# Altium footprint library Cty1.PcbLib: 870 footprints (part 11 of 55)
Each footprint in its own frame and in the unit in brackets; x right, y up, seen from the top. Pads: shape width x height; smd on the part's side, far side on the other; paste and mask are expansions set on the pad; w line width, h text height; cw(c..) or ccw(c..) is an arc to the next point about the centre after c.
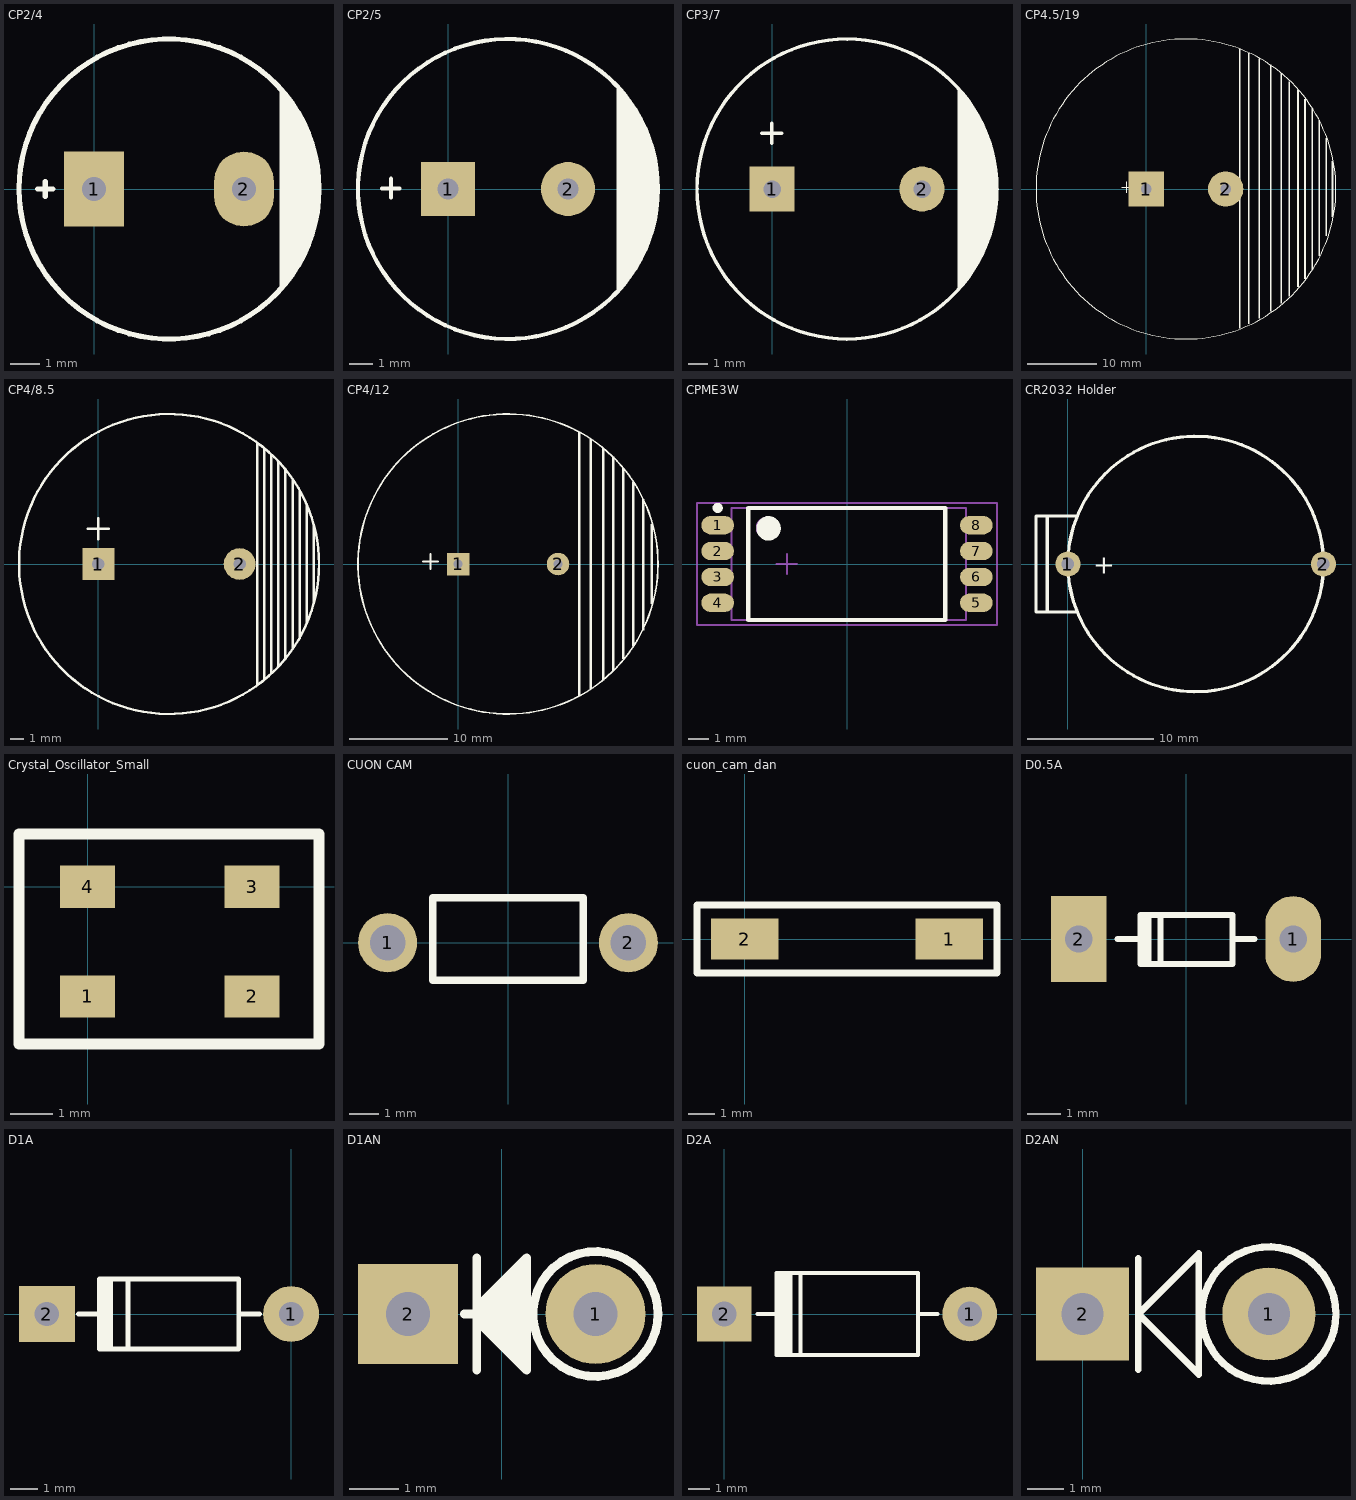
[diagram p10: the footprints below, top view; thin cyan lines are the x and y axes]

## CP2/4 [mil] "Tu hoa 1000uF/16V/25V"
height 400
pads (2):
  rect 80x100 hole 32: 1(0,0)
  oval 80x100 hole 32: 2(200,0)
Top Overlay:
  circle w7: c100,0 r200
  region: 248,133 248,-134 262,-117 274,-97 284,-81 293,-55 299,-21 298,21 296,46 281,85 258,122
  lines w7: -75,0 -55,0 ; -65,-10 -65,10

## CP2/5 [mil] "Tu hoa 1000uF/25V,50V"
height 600
pads (2):
  rect 90x90 hole 35: 1(0,0)
  round 90 hole 35: 2(200,0)
Top Overlay:
  circle w7: c100,0 r250
  region: 281,174 281,-175 300,-149 301,-151 318,-124 334,-90 349,-29 350,0 348,34 341,70 321,116
  lines w7: -110,1 -81,1 ; -95,-14 -95,17
3D body "User Library-Cap12_5x25.STEP": height 984.37, standoff -747.43, extent -141.06,-247.12 351.06,245

## CP3/7 [mil] "Tu hoa 4700uF/25V"
height 600
pads (2):
  rect 90x90 hole 35: 1(0,0)
  round 90 hole 35: 2(300,0)
Top Overlay:
  circle w7: c150,0 r300
  region: 425,112 433,96 442,79 447,39 450,-9 449,-34 442,-69 429,-115 397,-171 382,-191 371,-203 371,200 384.5,182.5 395,168 408,153
  lines w7: -21,112 19,112 ; -1,92 -1,132

## CP4.5/19 [mil] "Tu hoa 10,000uF/63V"
height 600
pads (2):
  rect 200x200 hole 60: 1(0,0)
  round 200 hole 60: 2(450,0)
Top Overlay:
  circle w7: c225,0 r850
  rectangle: 975,-380 985,390
  rectangle: 935,-455 945,455
  rectangle: 895,-510 905,510
  rectangle: 855,-555 865,560
  rectangle: 805,-610 815,610
  rectangle: 760,-650 770,655
  rectangle: 1015,-265 1025,290
  rectangle: 1050,-160 1060,160
  rectangle: 700,-695 710,705
  rectangle: 635,-735 645,740
  rectangle: 575,-765 585,770
  rectangle: 525,-790 535,795
  lines w7: -140,10 -80,10 ; -110,-20 -110,40

## CP4/8.5 [mil] "Tu hoa 4700uF/50V"
height 600
pads (2):
  rect 90x90 hole 35: 1(0,0)
  round 90 hole 35: 2(400,0)
Top Overlay:
  circle w7: c200,0 r425
  lines w7: -30,100 30,100 ; 0,70 0,130 ; 450,-340 450,340 ; 470,-325 470,325 ; 490,-310 490,310 ; 510,-290 510,290 ; 530,-265 530,265 ; 550,-240 550,240 ; 570,-210 570,205 ; 590,-165 590,170
  lines w8: 610,-110 610,110
3D body "User Library-ECEC2DP271BJ.STEP": height 984.25, standoff 0, extent -236.14,-438.07 630,428.07

## CP4/12 [mil] "Tu hoa 220uF/450V"
height 600
pads (2):
  rect 90x90 hole 35: 1(0,0)
  round 90 hole 35: 2(400,0)
Top Overlay:
  circle w7: c200,0 r600
  rectangle: 770,-160 780,160
  rectangle: 735,-265 745,260
  rectangle: 480,-530 490,530
  rectangle: 525,-500 535,500
  rectangle: 575,-465 585,465
  rectangle: 615,-425 625,430
  rectangle: 655,-380 665,385
  rectangle: 695,-330 705,330
  lines w7: -140,10 -80,10 ; -110,-20 -110,40

## CPME3W [mm] "SOP, 8-Leads, Body 5.3x5.3mm, Pitch 1.27mm, IPC Medium Density"
height 1.5
pads (8):
  oval 1.6x0.9 smd: 1(-6.35,1.905) 2(-6.35,0.635) 3(-6.35,-0.635) 4(-6.35,-1.905) 5(6.35,-1.905) 6(6.35,-0.635) 7(6.35,0.635) 8(6.35,1.905)
Top Overlay:
  circle w0.6: c-3.85,1.75 r0.3
  circle w0.25: c-6.35,2.755 r0.125
  lines w0.2: -4.85,-2.75 4.826,-2.75 4.826,2.75 -4.85,2.75 -4.85,-2.75
Mechanical 13:
  circle w0.1: c-3.929,1.778 r0.5
  lines w0.1: -5.675,-2.75 5.842,-2.75 5.842,2.75 -5.675,2.75 -5.675,-2.75
Mechanical 15:
  lines w0.1: -3.45,0 -2.45,0 ; -2.95,-0.5 -2.95,0.5 ; -7.366,-3 7.366,-3 7.366,3 -7.366,3 -7.366,-3

## CR2032 Holder [mm]
pads (2):
  round 2 hole 1: 1(0,0) 2(20.32,0)
Top Overlay:
  circle w0.254: c10.16,0 r10.161
  lines w0.254: -1.651,-3.81 -1.651,3.81 ; 0.635,-3.81 -2.54,-3.81 -2.54,3.81 0.635,3.81
  text "+" at 2.032,-0.762 h1.52

## Crystal_Oscillator_Small [mm]
pads (4):
  rect 1.3x1 smd: 1(0,-2.6) 2(3.9,-2.6) 3(3.9,0) 4(0,0)
Top Overlay:
  lines w0.254: -1.623,-3.73 -1.623,1.25 5.484,1.25 5.484,-3.73 -1.623,-3.73

## CUON CAM [mm] "Dang cam giong tro"
pads (2):
  round 2 hole 1.2: 1(-4.064,0) 2(4.064,0)
Top Overlay:
  lines w0.254: -2.54,-1.27 -2.54,1.524 2.54,1.524 2.54,-1.27 -2.54,-1.27

## cuon_cam_dan [mil] "cuon cam dan"
pads (2):
  rect 98.43x60 smd: 1(300,0) 2(0,0)
Top Overlay:
  lines w10: -70,-50 -70,50 370,50 370,-50 -70,-50

## D0.5A [mil] "Diode muoi, W 80mil, L 300mil"
height 80
pads (2):
  oval 65x100 hole 32: 1(125,0)
  rect 65x100 hole 32: 2(-125,0)
Top Overlay:
  rectangle: -55,-30 -40,25
  lines w7: -80,0 -53,0 ; -30,-29 -30,28 ; 54,0 80,0 ; -53,-29 54,-29 54,28 -53,28 -53,-29
3D body "SW3dPS-1N4148.STEP": height 61.22, standoff -50, extent -108.5,-32.96 108.5,32

## D1A [mil] "Diode 1A, W 100mil, L 350mil"
height 100
pads (2):
  round 80 hole 35: 1(0,0)
  rect 80x80 hole 35: 2(-350,0)
Top Overlay:
  rectangle: -275,-50 -255,50
  lines w7: -305,0 -275,0 ; -275,-16 -275,0 ; -275,21 -275,0 ; -234,-50 -234,47 ; -75,0 -45,0 ; -275,0 -275,50 -75,50 -75,-50 -275,-50 -275,0
3D body "SW3dPS-do_35.STEP": height 84.5, standoff -100, extent -386.49,-33 34.49,36

## D1AN [mil] "Diode 1A, W 100mil, L 150mil"
height 100
pads (2):
  round 80 hole 35: 1(75,0)
  rect 80x80 hole 35: 2(-75,0)
Top Overlay:
  circle w7: c75,0 r50
  region: 20,40 20,-40 15,-40 -20,-5 -20,5
  lines w7: -30,0 -20,0 ; -20,-45 -20,45 ; -20,-5 20,-45 20,45 -20,5 -20,-5
3D body "SW3dPS-1N4007_Stand.STEP": height 252.32, standoff -78.14, extent -64,-50 104,55

## D2A [mil] "Diode 2A, W 150mil, L 450mil"
height 100
pads (2):
  round 100 hole 45: 1(450,0)
  rect 100x100 hole 45: 2(0,0)
Top Overlay:
  rectangle: 95,-75 125,75
  lines w7: 61,0 96,0 ; 96,-31 96,0 ; 96,32 96,0 ; 140,-75 140,75 ; 355,0 391,0 ; 96,-75 96,75 355,75 355,-75 96,-75
3D body "SW3DPS-DIODE0_4.step": height 100.5, standoff -100, extent 5,-47 435,54

## D2AN [mil] "Diode 2A, W 150mil, L 450mil"
height 100
pads (2):
  round 100 hole 45: 1(200,0)
  rect 100x100 hole 45: 2(0,0)
Top Overlay:
  circle w8: c200,0 r72.11
  lines w7: 60,-60 60,60 ; 125,50 125,65 60,0 125,-65 125,55
3D body "SW3dPS-Zener 1W_Stand.STEP": height 252.32, standoff -78.14, extent 46.01,-49.99 214.01,55